# Altium footprint library devices.PCBLIB: 335 footprints (part 2 of 21)
Each footprint in its own frame and in the unit in brackets; x right, y up, seen from the top. Pads: shape width x height; smd on the part's side, far side on the other; paste and mask are expansions set on the pad; w line width, h text height; cw(c..) or ccw(c..) is an arc to the next point about the centre after c.
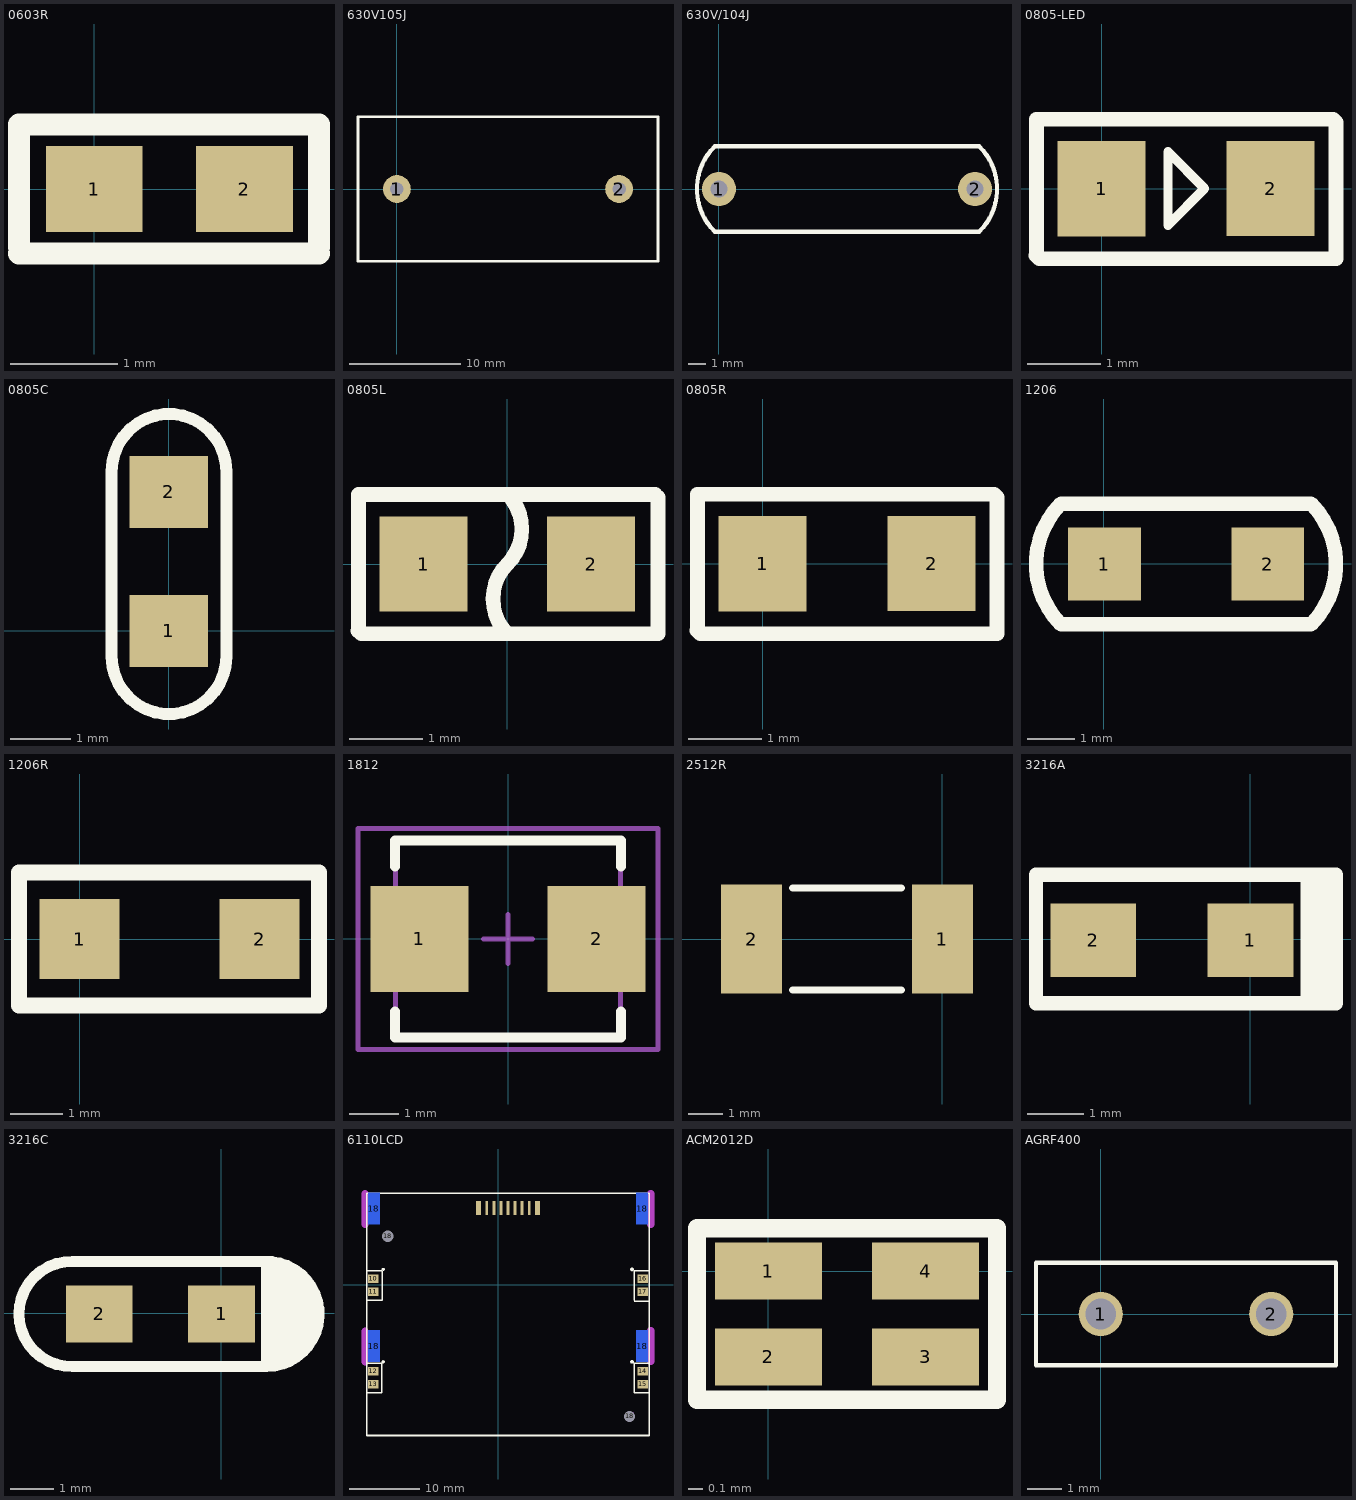
[diagram p1: the footprints below, top view; thin cyan lines are the x and y axes]

## 0603R [mm]
pads (2):
  rect 0.9x0.8 smd: 1(0,0) 2(1.4,0)
Top Overlay:
  lines w0.203: -0.7,-0.6 2.094,-0.6 ; -0.7,-0.543 -0.7,0.6 2.094,0.6 2.094,-0.543
3D body: height 0.45, standoff 0, extent -0.063,-0.4 1.537,0.4

## 630V105J [mm]
pads (2):
  round 2.5 hole 1.2: 1(0,0) 2(20,0)
Top Overlay:
  lines w0.254: -3.5,-6.5 -3.5,6.5 23.5,6.5 23.5,-6.5 -3.5,-6.5

## 630V/104J [mm]
pads (2):
  round 2 hole 1: 1(0,0) 2(15,0)
Top Overlay:
  lines w0.254: -0.25,-2.5 cw(c2.25,0) -0.25,2.5 15.25,2.5 cw(c12.75,0) 15.25,-2.5 -0.25,-2.5

## 0805-LED [mm]
pads (2):
  rect 1.2x1.3 smd: 1(-0.004,-0.004) 2(2.3,0)
Top Overlay:
  lines w0.127: 0.9,-0.5 0.9,0.5 1.4,0 0.9,-0.5
  lines w0.2: -0.9,-0.913 -0.893,-0.907 -0.893,0.943 -0.432,0.943 2.643,0.943 3.157,0.943 3.193,0.907 3.193,-0.957 2.643,-0.957 -0.432,-0.957 -0.857,-0.957 -0.9,-0.913
3D body: height 1.1, standoff 0, extent 0.133,-0.625 2.153,0.625

## 0805C [mm]
pads (2):
  rect 1.3x1.2 smd: 1(0.004,-0.004) 2(0,2.3)
Top Overlay:
  lines w0.2: -0.943,-0.432 ccw(c0.007,-0.432) 0.957,-0.432 0.957,2.643 ccw(c0.007,2.643) -0.943,2.643 -0.943,-0.432

## 0805L [mm]
pads (2):
  rect 1.2x1.3 smd: 1(-1.143,0) 2(1.143,0)
Top Overlay:
  lines w0.2: 0,-0.953 cw(c0.476,-0.476) 0,0 ccw(c-0.476,0.476) 0,0.953 ; -2.039,-0.909 -2.032,-0.903 -2.032,0.947 -1.571,0.947 1.504,0.947 2.018,0.947 2.054,0.911 2.054,-0.953 1.504,-0.953 -1.571,-0.953 -1.996,-0.953 -2.039,-0.909

## 0805R [mm]
pads (2):
  rect 1.2x1.3 smd: 1(-0.004,-0.004) 2(2.3,0)
Top Overlay:
  lines w0.2: -0.9,-0.913 -0.857,-0.957 -0.432,-0.957 2.643,-0.957 3.193,-0.957 3.193,0.907 3.157,0.943 2.643,0.943 -0.432,0.943 -0.893,0.943 -0.893,-0.907 -0.9,-0.913

## 1206 [mil]
pads (2):
  rect 60x60 smd: 1(0.5,-0.17) 2(135.5,-0.17)
Top Overlay:
  lines w12: -35.43,-50.17 cw(c14.57,-0.17) -35.43,49.83 25.5,49.83 110.5,49.83 171.26,49.83 cw(c121.26,-0.17) 171.26,-50.17 110.5,-50.17 25.5,-50.17 -35.43,-50.17

## 1206R [mil]
pads (2):
  rect 60x60 smd: 1(0,0) 2(135,0)
Top Overlay:
  lines w12: -45.5,-50 25,-50 110,-50 179.5,-50 179.5,50 110,50 25,50 -45.5,50 -45.5,-50

## 1812 [mm] "Molded Capacitor, 2-Leads, Body 4.3x3.6mm, IPC Medium Density"
height 2.44
pads (2):
  rect 2x2.15 smd: 1(-1.8,0) 2(1.8,0)
Top Overlay:
  lines w0.2: -2.3,-1.475 -2.3,-2 2.3,-2 2.3,-1.475 ; -2.3,1.475 -2.3,2 2.3,2 2.3,1.475
Mechanical 13:
  lines w0.1: -2.285,-1.97 -2.285,1.97 2.285,1.97 2.285,-1.97 -2.285,-1.97
Mechanical 15:
  lines w0.1: -0.5,0 0.5,0 ; 0,-0.5 0,0.5 ; -3.05,-2.25 -3.05,2.25 3.05,2.25 3.05,-2.25 -3.05,-2.25

## 2512R [mm]
pads (2):
  rect 1.8x3.2 smd: 1(0,0) 2(-5.6,0)
Top Overlay:
  lines w0.2: -4.4,-1.5 -1.2,-1.5 ; -4.4,1.5 -1.2,1.5

## 3216A [mm]
pads (2):
  rect 1.524x1.3 smd: 1(0.003,-0.022) 2(-2.791,-0.022)
Top Overlay:
  lines w0.254: 0.996,-1.143 -3.429,-1.143 -3.81,-1.143 -3.81,1.143 -3.429,1.143 1.016,1.143 ; 1.143,-1.143 1.143,1.143 ; 1.27,-1.143 1.27,1.143 ; 1.397,-1.143 1.397,1.143 ; 1.016,1.143 1.524,1.143 1.524,-0.254 1.524,-1.143 1.016,-1.143 1.016,1.143

## 3216C [mm]
pads (2):
  rect 1.524x1.3 smd: 1(0.003,-0.022) 2(-2.791,-0.022)
Top Overlay:
  rectangle: 1.153,-1.122 1.578,1.028
  rectangle: 1.453,-0.947 1.803,0.953
  rectangle: 1.678,-0.822 2.078,0.753
  rectangle: 1.753,-0.272 2.178,0.403
  rectangle: 1.078,-1.047 1.678,1.078
  lines w0.254: -3.397,-1.222 1.028,-1.222 ; -3.397,1.178 1.003,1.178 ; -3.396,-1.222 cw(c-3.422,-0.022) -3.396,1.178 ; 0.971,1.177 cw(c1.028,-0.022) 1.028,-1.222 ; 1.028,1.128 1.028,-1.222

## 6110LCD [mm]
height 6.86
pads (23):
  rect 0.7x2 smd: 1(5.53,10.882) 9(-2.77,10.882)
  rect 0.4x2 smd: 2(4.38,10.882) 3(3.38,10.882) 4(2.38,10.882) 5(1.38,10.882) 6(0.38,10.882) 7(-0.62,10.882) 8(-1.62,10.882)
  rect 1.5x1.2 smd: 10(-17.7,0.9) 11(-17.7,-1) 12(-17.7,-12.2) 13(-17.7,-14.1) 14(20.45,-12.2) 15(20.45,-14.1) 16(20.45,0.9) 17(20.45,-1)
  rect 1.6x4.4 smd far side: 18(-17.62,-8.659) 18(20.38,-8.659)
  rect 1.6x4.5 smd far side: 18(-17.62,10.823) 18(20.38,10.823)
  round 1.5 on Mech1 hole 1.6: 18(-15.638,6.886) 18(18.606,-18.63)
Top Overlay:
  circle w0.254: c-16.3,2.2 r0.1
  circle w0.254: c18.959,2.2 r0.141
  circle w0.254: c-16.3,-10.9 r0.1
  circle w0.254: c18.959,-10.9 r0.141
  lines w0.2: -18.62,-15.266 -16.512,-15.266 -16.512,-11.1 -18.62,-11.1 ; -18.605,2.025 -16.497,2.025 ; -18.555,-2.201 -16.446,-2.201 -16.446,1.959 ; 19.241,-2.293 21.349,-2.293 ; 19.241,-2.201 19.241,1.959 ; 19.241,2.025 21.349,2.025 ; 21.369,-15.26 19.261,-15.26 19.261,-11.1 21.4,-11.1
  lines w0.254: -18.62,-21.318 21.38,-21.318 21.38,12.982 -18.62,12.982 -18.62,-21.318
Keep-Out Layer:
  lines w1: -18.85,-10.9 -18.85,-6.5 ; -18.85,8.55 -18.85,12.95 ; 21.6,-10.85 21.6,-6.45 ; 21.6,8.55 21.6,12.95
Mechanical 1:
  lines w1: -18.85,-10.9 -18.85,-6.5 ; -18.85,8.55 -18.85,12.95 ; 21.6,-10.85 21.6,-6.45 ; 21.6,8.55 21.6,12.95

## ACM2012D [mm]
pads (4):
  rect 0.75x0.4 smd: 1(0,0) 2(0,-0.6) 3(1.1,-0.6) 4(1.1,0)
Top Overlay:
  lines w0.127: -0.5,-0.9 -0.5,0.3 1.6,0.3 1.6,-0.9 -0.5,-0.9

## AGRF400 [mm]
pads (2):
  round 1.3 hole 0.9: 1(0,0) 2(5,0)
Top Overlay:
  lines w0.127: -1.9,-1.5 -1.9,1.5 6.9,1.5 6.9,-1.5 -1.9,-1.5